# Altium footprint library My Library.PcbLib: 872 footprints (part 32 of 55)
Each footprint in its own frame and in the unit in brackets; x right, y up, seen from the top. Pads: shape width x height; smd on the part's side, far side on the other; paste and mask are expansions set on the pad; w line width, h text height; cw(c..) or ccw(c..) is an arc to the next point about the centre after c.
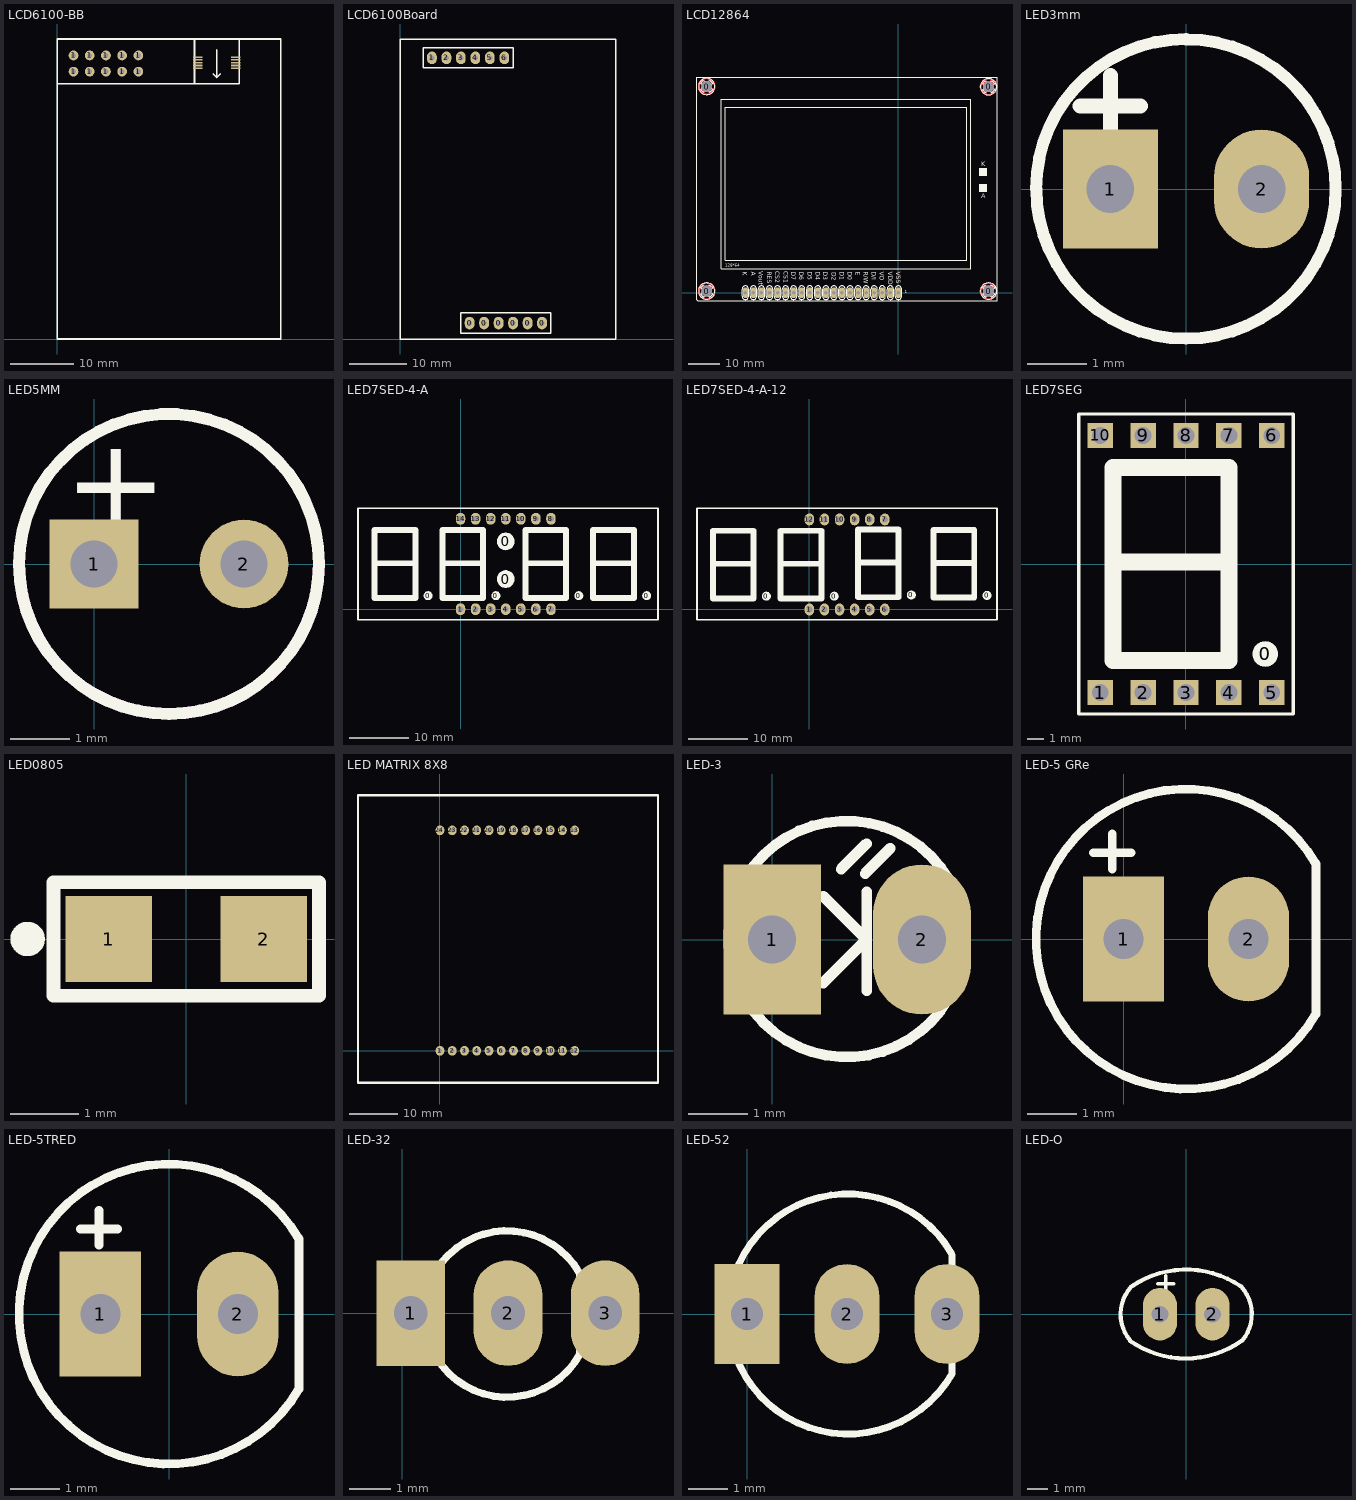
[diagram p31: the footprints below, top view; thin cyan lines are the x and y axes]

## LCD6100-BB [mil]
pads (20):
  round 60 hole 30: 1(100,1649) 1(100,1749) 1(200,1649) 1(200,1749) 1(300,1649) 1(300,1749) 1(400,1649) 1(400,1749) 1(500,1649) 1(500,1749)
  rect 59.06x9.84 smd: 1(865.83,1669.92) 1(1101.83,1669.92) 2(865.83,1686.92) 2(1101.83,1686.92) 3(865.83,1704.42) 3(1101.83,1704.42) 4(865.83,1721.92) 4(1101.83,1721.92) 5(865.83,1738.92) 5(1101.83,1738.92)
Top Overlay:
  lines w10: 0,0 1377.95,0 1377.95,1849.39 ; 0,1 0,1850.39 1377.95,1850.39 ; 0,1574.8 1122.05,1574.8 ; 961.96,1634.89 983.96,1612.89 ; 983.96,1782.89 983.96,1612.89 ; 1005.96,1634.89 983.96,1612.89 ; 1122.05,1574.8 1122.05,1850.39 846.46,1850.39 846.46,1574.8 1122.05,1574.8

## LCD6100Board [mm] "LCD Nokia 6100 Board"
pads (12):
  oval 1.7x2.2 hole 0.9: 0(12.192,2.794) 0(14.732,2.794) 0(17.272,2.794) 0(19.812,2.794) 0(22.352,2.794) 0(24.892,2.794) 1(5.588,49.276) 2(8.128,49.276) 3(10.668,49.276) 4(13.208,49.276) 5(15.748,49.276) 6(18.288,49.276)
Top Overlay:
  lines w0.254: 0,0 37.846,0 37.846,52.578 0,52.578 0,0 ; 4.039,47.498 4.039,51.054 19.812,51.054 19.812,47.498 4.039,47.498 ; 10.643,1.016 26.416,1.016 26.416,4.572 10.643,4.572 10.643,1.016

## LCD12864 [mil] "GLCD"
pads (24):
  round 135 hole 133: 0(-2380,20) 0(-2380,2560) 0(1120,20) 0(1120,2557)
  oval 70x135 hole 44: 1(0,0) 2(-100,0) 3(-200,0) 4(-300,0) 5(-400,0) 6(-500,0) 7(-600,0) 8(-700,0) 9(-800,0) 10(-900,0) 11(-1000,0) 12(-1100,0) 13(-1200,0) 14(-1300,0) 15(-1400,0) 16(-1500,0) 17(-1600,0) 18(-1700,0) 19(-1800,0) 20(-1900,0)
Top Layer:
  circle w20: c-2380,20 r100
  circle w20: c-2380,2561 r100
  circle w20: c1120,2557 r100
  circle w20: c1120,20 r100
  lines w25: -2458.13,53.48 cw(c-2380,20) -2418.01,96.03 ; -2458.13,2594.48 cw(c-2380,2561) -2418.01,2637.03 ; -2456.03,-18.01 ccw(c-2380,20) -2413.48,-58.13 ; -2456.03,2522.99 ccw(c-2380,2561) -2413.48,2482.87 ; -2346.52,98.13 cw(c-2380,20) -2303.97,58.01 ; -2346.52,2639.13 cw(c-2380,2561) -2303.97,2599.01 ; -2341.99,-56.03 ccw(c-2380,20) -2301.87,-13.48 ; -2341.99,2484.97 ccw(c-2380,2561) -2301.87,2527.52 ; 1041.87,53.48 cw(c1120,20) 1081.99,96.03 ; 1041.87,2590.48 cw(c1120,2557) 1081.99,2633.03 ; 1043.97,-18.01 ccw(c1120,20) 1086.52,-58.13 ; 1043.97,2518.99 ccw(c1120,2557) 1086.52,2478.87 ; 1153.48,98.13 cw(c1120,20) 1196.03,58.01 ; 1153.48,2635.13 cw(c1120,2557) 1196.03,2595.01 ; 1158.01,-56.03 ccw(c1120,20) 1198.13,-13.48 ; 1158.01,2480.97 ccw(c1120,2557) 1198.13,2523.52
Bottom Layer:
  circle w20: c-2380,20 r100
  circle w20: c-2380,2561 r100
  circle w20: c1120,2557 r100
  circle w20: c1120,20 r100
  lines w25: -2458.13,53.48 cw(c-2380,20) -2418.01,96.03 ; -2458.13,2594.48 cw(c-2380,2561) -2418.01,2637.03 ; -2456.03,-18.01 ccw(c-2380,20) -2413.48,-58.13 ; -2456.03,2522.99 ccw(c-2380,2561) -2413.48,2482.87 ; -2346.52,98.13 cw(c-2380,20) -2303.97,58.01 ; -2346.52,2639.13 cw(c-2380,2561) -2303.97,2599.01 ; -2341.99,-56.03 ccw(c-2380,20) -2301.87,-13.48 ; -2341.99,2484.97 ccw(c-2380,2561) -2301.87,2527.52 ; 1041.87,53.48 cw(c1120,20) 1081.99,96.03 ; 1041.87,2590.48 cw(c1120,2557) 1081.99,2633.03 ; 1043.97,-18.01 ccw(c1120,20) 1086.52,-58.13 ; 1043.97,2518.99 ccw(c1120,2557) 1086.52,2478.87 ; 1153.48,98.13 cw(c1120,20) 1196.03,58.01 ; 1153.48,2635.13 cw(c1120,2557) 1196.03,2595.01 ; 1158.01,-56.03 ccw(c1120,20) 1198.13,-13.48 ; 1158.01,2480.97 ccw(c1120,2557) 1198.13,2523.52
Top Overlay:
  drawing of 158 lines, arcs and shapes, not listed
  text "1" at 77.5,-10 h36
  text "128*64" at -2150,325 h36
  text "K" at 1027.5,1572.5 h60
  text "A" at 1027.5,1172.5 h60
  text "VSS" at -27.5,260 h55
  text "VDD" at -125,262.5 h55
  text "VO" at -232.5,262.5 h55
  text "E" at -527.5,257.5 h55
  text "D0" at -627.5,257.5 h55
  text "D1" at -727.5,257.5 h55
  text "D2" at -827.5,255 h55
  text "D3" at -930,257.5 h55
  text "D4" at -1027.5,257.5 h55
  text "D5" at -1127.5,257.5 h55
  text "D6" at -1230,260 h55
  text "D7" at -1327.5,260 h55
  text "CS1" at -1425,265 h55
  text "CS2" at -1527.5,265 h55
  text "RES" at -1630,262.5 h55
  text "Vout" at -1732.5,267.5 h55
  text "A" at -1825,257.5 h55
  text "K" at -1930,257.5 h55
  text "R/W" at -430,257.5 h55
  text "D/I" at -327.5,262.5 h55
Bottom Overlay:
  lines w10: -1940,-45 ccw(c-1900,-45) -1860,-45 -1860,45 ccw(c-1900,45) -1940,45 -1940,-45 ; -1840,-45 ccw(c-1800,-45) -1760,-45 -1760,45 ccw(c-1800,45) -1840,45 -1840,-45 ; -1740,-45 ccw(c-1700,-45) -1660,-45 -1660,45 ccw(c-1700,45) -1740,45 -1740,-45 ; -1640,-45 ccw(c-1600,-45) -1560,-45 -1560,45 ccw(c-1600,45) -1640,45 -1640,-45 ; -1540,-45 ccw(c-1500,-45) -1460,-45 -1460,45 ccw(c-1500,45) -1540,45 -1540,-45 ; -1440,-45 ccw(c-1400,-45) -1360,-45 -1360,45 ccw(c-1400,45) -1440,45 -1440,-45 ; -1340,-45 ccw(c-1300,-45) -1260,-45 -1260,45 ccw(c-1300,45) -1340,45 -1340,-45 ; -1240,-45 ccw(c-1200,-45) -1160,-45 -1160,45 ccw(c-1200,45) -1240,45 -1240,-45 ; -1140,-45 ccw(c-1100,-45) -1060,-45 -1060,45 ccw(c-1100,45) -1140,45 -1140,-45 ; -1040,-45 ccw(c-1000,-45) -960,-45 -960,45 ccw(c-1000,45) -1040,45 -1040,-45 ; -940,-45 ccw(c-900,-45) -860,-45 -860,45 ccw(c-900,45) -940,45 -940,-45 ; -840,-45 ccw(c-800,-45) -760,-45 -760,45 ccw(c-800,45) -840,45 -840,-45 ; -740,-45 ccw(c-700,-45) -660,-45 -660,45 ccw(c-700,45) -740,45 -740,-45 ; -640,-45 ccw(c-600,-45) -560,-45 -560,45 ccw(c-600,45) -640,45 -640,-45 ; -540,-45 ccw(c-500,-45) -460,-45 -460,45 ccw(c-500,45) -540,45 -540,-45 ; -440,-45 ccw(c-400,-45) -360,-45 -360,45 ccw(c-400,45) -440,45 -440,-45 ; -340,-45 ccw(c-300,-45) -260,-45 -260,45 ccw(c-300,45) -340,45 -340,-45 ; -240,-45 ccw(c-200,-45) -160,-45 -160,45 ccw(c-200,45) -240,45 -240,-45 ; -140,-45 ccw(c-100,-45) -60,-45 -60,45 ccw(c-100,45) -140,45 -140,-45 ; -40,-45 ccw(c0,-45) 40,-45 40,45 ccw(c0,45) -40,45 -40,-45
Bottom Solder:
  circle w25: c-2380,20 r85.44
  circle w25: c-2380,2561 r85.44
  circle w25: c1120,2557 r85.44
  circle w25: c1120,20 r85.44

## LED3mm [mm]
pads (2):
  rect 1.6x2 hole 0.8: 1(-1.27,0)
  oval 1.6x2 hole 0.8: 2(1.27,0)
Top Overlay:
  lines w0.203: -2.521,0 cw(c0,0) 0,2.521 ; -2.514,0 ccw(c0,0) 0,-2.514 ccw(c0,0) 2.514,0 ccw(c0,0) 0,2.514
  lines w0.254: -1.778,1.397 -0.762,1.397 ; -1.27,0.889 -1.27,1.905
3D body "SW3DPS-REDLED-DIP.step": height 5.38, standoff -3.17, extent -1.992,-1.499 1.992,1.994

## LED5MM [mm]
pads (2):
  rect 1.5x1.5 hole 0.8: 1(0,0)
  round 1.5 hole 0.8: 2(2.54,0)
Top Overlay:
  lines w0.203: -1.27,0 ccw(c1.27,0) 1.27,-2.54 ccw(c1.27,0) 3.81,0 ccw(c1.27,0) -1.27,0
  text "+" at -0.508,0.635 h1.52
Mechanical 1:
  lines w0.203: -1.27,0 ccw(c1.27,0) 1.27,-2.54 ccw(c1.27,0) 3.81,0

## LED7SED-4-A [mm]
pads (20):
  round 1.524 on Top Overlay: 0(-5.461,2.286) 0(5.969,2.286) 0(19.939,2.286) 0(31.369,2.286)
  round 3 on Top Overlay: 0(7.62,5.08) 0(7.62,11.43)
  oval 1.6x2 hole 1: 1(0,0) 2(2.54,0) 3(5.08,0) 4(7.62,0) 5(10.16,0) 6(12.7,0) 7(15.24,0) 8(15.24,15.24) 9(12.7,15.24) 10(10.16,15.24) 11(7.62,15.24) 12(5.08,15.24) 13(2.54,15.24) 14(0,15.24)
Top Overlay:
  lines w0.254: -17.272,-1.778 -17.272,17.018 33.274,17.018 33.274,-1.778 -17.272,-1.778
  lines w1: -14.351,7.747 -7.62,7.747 ; -2.921,7.747 3.81,7.747 ; 11.049,7.747 17.78,7.747 ; 22.479,7.747 29.21,7.747 ; -14.478,1.905 -14.478,13.335 -7.62,13.335 -7.62,1.905 -14.478,1.905 ; -3.048,1.905 -3.048,13.335 3.81,13.335 3.81,1.905 -3.048,1.905 ; 10.922,1.905 10.922,13.335 17.78,13.335 17.78,1.905 10.922,1.905 ; 22.352,1.905 22.352,13.335 29.21,13.335 29.21,1.905 22.352,1.905
3D body "SW3DPS-7SEGMENT DISPLAY.STEP": height 8.03, standoff -3.97, extent 20.701,-1.88 33.401,17.17
3D body "SW3DPS-7SEGMENT DISPLAY.STEP": height 8.03, standoff -3.97, extent 8.001,-1.88 20.701,17.17
3D body "SW3DPS-7SEGMENT DISPLAY.STEP": height 8.03, standoff -3.97, extent -4.699,-1.88 8.001,17.17
3D body "SW3DPS-7SEGMENT DISPLAY.STEP": height 8.03, standoff -3.97, extent -17.38,-1.88 -4.68,17.17

## LED7SED-4-A-12 [mm]
pads (16):
  round 1.524 on Top Overlay: 0(-7.239,2.235) 0(4.191,2.235) 0(17.17,2.438) 0(29.921,2.362)
  oval 1.6x2 hole 1: 1(0,0) 2(2.54,0) 3(5.08,0) 4(7.62,0) 5(10.16,0) 6(12.7,0) 7(12.7,15.164) 8(10.16,15.164) 9(7.62,15.164) 10(5.08,15.164) 11(2.54,15.164) 12(0,15.164)
Top Overlay:
  lines w0.254: -18.923,-1.702 31.598,-1.702 31.598,17.018 -18.923,17.018 -18.923,-1.702
  lines w1: -16.129,7.696 -9.398,7.696 ; -4.699,7.696 2.032,7.696 ; 8.28,7.899 15.011,7.899 ; 21.031,7.823 27.762,7.823 ; -16.256,1.854 -16.256,13.259 -9.398,13.259 -9.398,1.854 -16.256,1.854 ; -4.826,1.854 2.032,1.854 2.032,13.259 -4.826,13.259 -4.826,1.854 ; 8.153,2.057 15.011,2.057 15.011,13.487 8.153,13.487 8.153,2.057 ; 20.904,1.981 20.904,13.411 27.762,13.411 27.762,1.981 20.904,1.981
3D body "SW3DPS-7SEGMENT DISPLAY.STEP": height 8.03, standoff -3.97, extent 19.05,-1.854 31.75,17.196
3D body "SW3DPS-7SEGMENT DISPLAY.STEP": height 8.03, standoff -3.97, extent 6.35,-1.854 19.05,17.196
3D body "SW3DPS-7SEGMENT DISPLAY.STEP": height 8.03, standoff -3.97, extent -6.35,-1.854 6.35,17.196
3D body "SW3DPS-7SEGMENT DISPLAY.STEP": height 8.03, standoff -3.97, extent -19.05,-1.854 -6.35,17.196

## LED7SEG [mm] "LED7SEG"
pads (11):
  round 1.524 on Top Overlay: 0(4.724,-5.334)
  rect 1.5x1.5 hole 1: 1(-5.055,-7.62) 2(-2.515,-7.62) 3(0.025,-7.62) 4(2.565,-7.62) 5(5.105,-7.62) 6(5.105,7.62) 7(2.565,7.62) 8(0.025,7.62) 9(-2.515,7.62) 10(-5.055,7.62)
Top Overlay:
  lines w0.2: -6.325,-8.89 6.375,-8.89 6.375,8.89 -6.325,8.89 -6.325,-8.89
  lines w1: -4.166,0.127 2.565,0.127 ; -4.293,-5.715 -4.293,5.715 2.565,5.715 2.565,-5.715 -4.293,-5.715
3D body "SW3DPS-7SEGMENT DISPLAY.STEP": height 8.03, standoff -3.97, extent -6.35,-9.525 6.35,9.525

## LED0805 [mil] "Chip Resistor; Body 2.0 x 1.3 mm (LxW typ)"
height 100
pads (2):
  rect 50x50 smd: 1(-45,0) 2(45,0)
Top Overlay:
  circle w10: c-92,0 r5
  lines w7.87: 77,32 77,-33 -77,-33 -77,33 77,33
3D body: height 47.24, standoff 19.68, extent -35,-25 35,25
3D body: height 19.68, standoff 0, extent -60,-25 60,25

## LED MATRIX 8X8 [mm]
pads (24):
  oval 1.8x2 hole 0.9: 1(0,0) 2(2.54,0) 3(5.08,0) 4(7.62,0) 5(10.16,0) 6(12.7,0) 7(15.24,0) 8(17.78,0) 9(20.32,0) 10(22.86,0) 11(25.4,0) 12(27.94,0) 13(27.94,45.72) 14(25.4,45.72) 15(22.86,45.72) 16(20.32,45.72) 17(17.78,45.72) 18(15.24,45.72) 19(12.7,45.72) 20(10.16,45.72) 21(7.62,45.72) 22(5.08,45.72) 23(2.54,45.72) 24(0,45.72)
Top Overlay:
  lines w0.5: -17.006,-6.65 -17.006,53.04 -2.401,53.04 45.224,53.04 45.224,-6.65 -17.006,-6.65

## LED-3 [mil] "LED 2 PIN, 3ly Only colour"
height 300
pads (2):
  rect 65x100 hole 32: 1(0,0)
  oval 65x100 hole 32: 2(100,0)
Top Overlay:
  lines w7: 34,-29 63,0 34,29 ; 46,47 63,64 ; 62,44 79,61 ; 63,-34 63,32 ; 117.92,-39.35 117.92,39.84
  lines w7.01: 117.57,-39.74 cw(c49.8,0.35) 117.72,40.19
3D body "SW3DPS-LED DIP 3MM-DEFAULT.STEP": height 217.14, standoff -117.51, extent -12.99,-74.8 124.8,74.81

## LED-5 GRe [mil] "LED 2 PIN, 5 ly , Only colour,pin to pin 100mil"
height 300
pads (2):
  rect 65x100 hole 32: 1(0,0)
  oval 65x100 hole 32: 2(100,0)
Top Overlay:
  lines w7: -24,69 6,69 ; -9,56 -9,84 ; 153.51,60.71 ccw(c50,0) 153.94,-59.97 ; 154,-59 154,60
3D body "SW3dPS-LED green.STEP": height 336.82, standoff -117.51, extent -54.33,-103.65 154.33,105.01

## LED-5TRED [mil] "LED 2 PIN, 5 ly , Only colour, pin to pin 110mil"
height 300
pads (2):
  rect 65x100 hole 32: 1(-55,0)
  oval 65x100 hole 32: 2(55,0)
Top Overlay:
  lines w7: -71,68 -41,68 ; -56,55 -56,83 ; 103.51,60.71 ccw(c0,0) 103.94,-59.97 ; 104,-59 104,60
3D body "SW3dPS-LEDd5R.STEP": height 339.18, standoff -243.49, extent -115.69,-117 97.7,120

## LED-32 [mil] "LED 3 PIN, 3ly Two colour"
height 300
pads (3):
  rect 65x100 hole 32: 1(8,0)
  oval 65x100 hole 32: 2(100,0) 3(192,0)
Top Overlay:
  lines w7: 168,-39 168,37
  lines w7.01: 167.87,37.48 ccw(c99.08,-0.84) 167.97,-38.98

## LED-52 [mil] "LED 3 PIN, 5 ly , Two colour"
height 300
pads (3):
  rect 65x100 hole 32: 1(0,0)
  oval 65x100 hole 32: 2(100,0) 3(200,0)
Top Overlay:
  lines w7: 204.51,60.71 ccw(c101,0) 204.94,-59.97 ; 205,-59 205,59

## LED-O [mil] "LED 2 PIN,  Ovan Only colour, pin to pin 110mil"
height 300
pads (2):
  oval 65x100 hole 32: 1(-50,0) 2(50,0)
Top Overlay:
  lines w7: -54,58 -24,58 ; -39,43 -39,73
  lines w8: -106.82,-49.85 cw(c-47,0) -104.5,52.5 ; -106.38,-51.11 ccw(c-0.81,100.81) 104.97,-50.96 ; -102.83,53.79 cw(c0,-100) 103.93,53.04 ; 104.5,52.5 cw(c47,0) 106.82,-49.85